# Altium footprint library SINA.PcbLib: 103 footprints (part 1 of 7)
Each footprint in its own frame and in the unit in brackets; x right, y up, seen from the top. Pads: shape width x height; smd on the part's side, far side on the other; paste and mask are expansions set on the pad; w line width, h text height; cw(c..) or ccw(c..) is an arc to the next point about the centre after c.
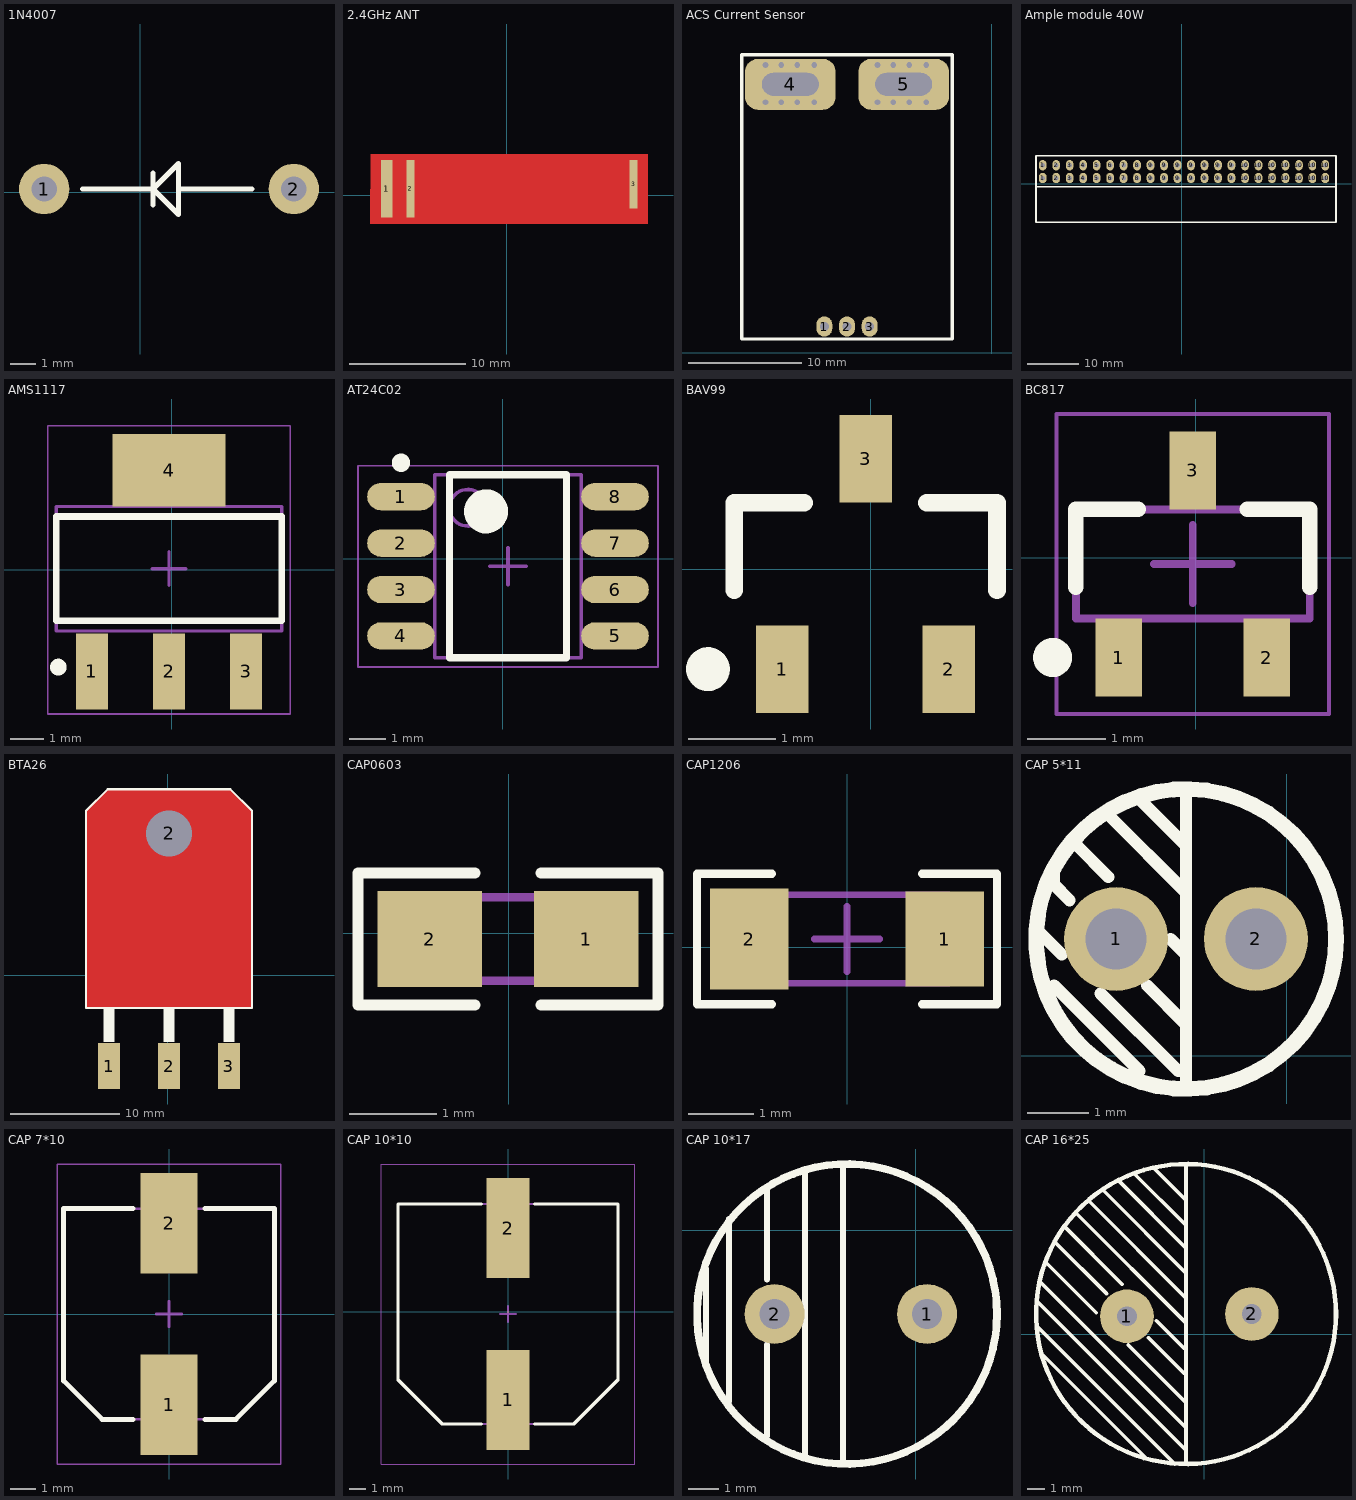
[diagram p0: the footprints below, top view; thin cyan lines are the x and y axes]

## 1N4007 [mm]
pads (2):
  round 2 hole 1: 1(-3.81,0.127) 2(6.096,0.127)
Top Overlay:
  lines w0.2: -2.286,0.127 0.508,0.127 ; 0.508,-0.508 0.508,0.762 ; 4.445,0.127 1.524,0.127 ; 0.508,0.127 1.524,-0.889 1.524,0.127 ; 0.508,0.127 1.524,1.143 1.524,0.127
3D body "User Library-DO-41-2.STEP": height 2.72, standoff -2.6, extent -4.369,-1.196 6.655,1.524

## 2.4GHz ANT [mm]
pads (3):
  rect 1x5 smd: 1(-10.364,0.558)
  rect 0.7x5 smd: 2(-8.332,0.558)
  rect 0.7x4.2 smd: 3(10.956,0.953)
Top Layer:
  rectangle: -10.854,2.353 -6.294,3.053
  region: -6.294,0.453 -6.294,3.053 -6.994,3.053 -6.994,0.453
  region: -4.094,1.153 -6.994,1.153 -6.994,0.453 -4.094,0.453
  region: -4.094,0.453 -4.094,3.053 -4.794,3.053 -4.794,0.453
  region: -1.894,3.053 -4.794,3.053 -4.794,2.353 -1.894,2.353
  region: -1.894,0.453 -1.894,3.053 -2.594,3.053 -2.594,0.453
  region: 0.306,1.153 -2.594,1.153 -2.594,0.453 0.306,0.453
  region: 0.306,0.453 0.306,3.053 -0.394,3.053 -0.394,0.453
  region: 2.506,3.053 -0.394,3.053 -0.394,2.353 2.506,2.353
  region: 2.506,0.453 2.506,3.053 1.806,3.053 1.806,0.453
  region: 4.706,1.153 1.806,1.153 1.806,0.453 4.706,0.453
  region: 4.706,0.453 4.706,3.053 4.006,3.053 4.006,0.453
  region: 6.906,3.053 4.006,3.053 4.006,2.353 6.906,2.353
  region: 6.906,0.453 6.906,3.053 6.206,3.053 6.206,0.453
  region: 9.106,1.153 6.206,1.153 6.206,0.453 9.106,0.453
  region: 9.106,0.453 9.106,3.053 8.406,3.053 8.406,0.453
  region: 11.306,3.053 8.406,3.053 8.406,2.353 11.306,2.353
  pour cut-out: -11.782,3.553 12.186,3.553 12.186,-2.487 -11.826,-2.487

## ACS Current Sensor [mm]
pads (5):
  oval 1.4x1.8 hole 0.8: 1(-14.8,2.3) 2(-12.8,2.3) 3(-10.8,2.3)
  rrect50% 8x4.5 hole 5 slot 2 at 90 deg: 4(-17.8,23.7) 5(-7.8,23.7)
via -5.8,22.1 diameter 0.9 hole 0.5
via -10.1,22.1 diameter 0.9 hole 0.5
via -8.7,22.1 diameter 0.9 hole 0.5
via -7.3,22.1 diameter 0.9 hole 0.5
via -7.3,25.4 diameter 0.9 hole 0.5
via -8.7,25.4 diameter 0.9 hole 0.5
via -10.1,25.4 diameter 0.9 hole 0.5
via -5.8,25.4 diameter 0.9 hole 0.5
via -15.7,22.1 diameter 0.9 hole 0.5
via -20,22.1 diameter 0.9 hole 0.5
via -18.6,22.1 diameter 0.9 hole 0.5
via -17.2,22.1 diameter 0.9 hole 0.5
via -17.2,25.4 diameter 0.9 hole 0.5
via -18.6,25.4 diameter 0.9 hole 0.5
via -20,25.4 diameter 0.9 hole 0.5
via -15.7,25.4 diameter 0.9 hole 0.5
Top Overlay:
  lines w0.3: -22.1,1.2 -3.5,1.2 -3.5,26.3 -22.1,26.3 -22.1,1.2
3D body "User Library-ACS759xCB.STEP": height 7.5, standoff -3, extent -19.8,2.1 -5.8,24.44

## Ample module 40W [mm]
pads (44):
  oval 1.5x2 hole 0.9: 1(-27.1,1.1) 1(-27.1,3.6) 2(-24.475,1.1) 2(-24.475,3.6) 3(-21.85,1.1) 3(-21.85,3.6) 4(-19.225,1.1) 4(-19.225,3.6) 5(-16.6,1.1) 5(-16.6,3.6) 6(-13.974,1.1) 6(-13.974,3.6) 7(-11.349,1.1) 7(-11.349,3.6) 8(-8.724,1.1) 8(-8.724,3.6) 9(-6.099,1.1) 9(-6.099,3.6) 9(-3.474,1.1) 9(-3.474,3.6) 9(-0.849,1.1) 9(-0.849,3.6) 9(1.776,1.1) 9(1.776,3.6) 9(4.401,1.1) 9(4.401,3.6) 9(7.027,1.1) 9(7.027,3.6) 9(9.652,1.1) 9(9.652,3.6) 10(12.277,1.1) 10(12.277,3.6) 10(14.902,1.1) 10(14.902,3.6) 10(17.527,1.1) 10(17.527,3.6) 10(20.152,1.1) 10(20.152,3.6) 10(22.777,1.1) 10(22.777,3.6) 10(25.402,1.1) 10(25.402,3.6) 10(27.903,1.1) 10(27.903,3.6)
Top Overlay:
  lines w0.3: -28.4,-0.6 30,-0.6 ; -28.4,-7.5 -28.4,5.45 30,5.45 30,-7.5 -28.4,-7.5
3D body "PCB1.step": height 42.12, standoff 2.1, extent -28.39,-7.6 39.19,5.5
3D body: height 2.5, standoff 0, extent -28.399,-0.15 30,5

## AMS1117 [mm]
pads (4):
  rect 0.95x2.25 smd: 1(-2.374,-3.019) 2(-0.084,-3.019) 3(2.206,-3.019)
  rect 3.35x2.15 smd: 4(-0.084,2.958)
Top Overlay:
  circle w0.25: c-3.374,-2.892 r0.125
  lines w0.2: -3.434,-1.517 3.266,-1.517 3.266,1.583 -3.434,1.583 -3.434,-1.517
Mechanical 13:
  lines w0.1: -3.434,-1.817 3.266,-1.817 3.266,1.883 -3.434,1.883 -3.434,-1.817
Mechanical 15:
  lines w0.05: -3.684,-4.285 3.516,-4.285 3.516,4.283 -3.684,4.283 -3.684,-4.285
  lines w0.1: -0.584,0.033 0.416,0.033 ; -0.084,-0.467 -0.084,0.533
3D body: height 1.8, standoff 0.02, extent -3.434,-1.817 3.266,1.883

## AT24C02 [mm]
pads (8):
  oval 1.85x0.75 smd: 1(-2.788,1.704) 2(-2.788,0.434) 3(-2.788,-0.836) 4(-2.788,-2.106) 5(3.062,-2.106) 6(3.062,-0.836) 7(3.062,0.434) 8(3.062,1.704)
Top Overlay:
  circle w0.25: c-2.788,2.629 r0.125
  circle w0.6: c-0.463,1.299 r0.3
  lines w0.2: -1.463,-2.701 -1.463,2.299 1.737,2.299 1.737,-2.701 -1.463,-2.701
Mechanical 13:
  circle w0.1: c-0.963,1.399 r0.5
  lines w0.1: -1.863,-2.701 -1.863,2.299 2.137,2.299 2.137,-2.701 -1.863,-2.701
Mechanical 15:
  lines w0.05: -3.963,-2.951 -3.963,2.549 4.237,2.549 4.237,-2.951 -3.963,-2.951
  lines w0.1: -0.363,-0.201 0.637,-0.201 ; 0.137,-0.701 0.137,0.299
3D body "LM358.step": height 1.35, standoff 0, extent -3.113,-2.701 3.387,2.299

## BAV99 [mm]
pads (3):
  rect 0.6x1 smd: 1(-1.011,-1.138) 2(0.889,-1.138) 3(-0.061,1.262)
Top Overlay:
  circle w0.25: c-1.861,-1.138 r0.125
  lines w0.2: -1.56,-0.238 -1.56,0.761 -0.761,0.761 ; 0.639,0.761 1.439,0.761 1.439,-0.238
3D body: height 1, standoff 0, extent -1.58,-0.283 1.447,0.796

## BC817 [mm]
pads (3):
  rect 0.6x1 smd: 1(-0.989,-1.28) 2(0.911,-1.28) 3(-0.039,1.12)
Top Overlay:
  circle w0.25: c-1.839,-1.28 r0.125
  lines w0.2: -1.539,-0.38 -1.539,0.62 -0.739,0.62 ; 0.661,0.62 1.461,0.62 1.461,-0.38
Mechanical 13:
  lines w0.1: -1.539,-0.78 1.461,-0.78 1.461,0.62 -1.539,0.62 -1.539,-0.78
Mechanical 15:
  lines w0.05: -1.789,-2.005 1.711,-2.005 1.711,1.845 -1.789,1.845 -1.789,-2.005
  lines w0.1: -0.539,-0.08 0.461,-0.08 ; -0.039,-0.58 -0.039,0.42
3D body: height 1.1, standoff 0.05, extent -1.539,-0.78 1.461,0.62

## BTA26 [mm]
pads (4):
  rect 2x4.2 smd: 1(-5.353,-8.301) 2(0.127,-8.301) 3(5.607,-8.301)
  round 3 hole 4.2: 2(0.127,12.954)
Top Layer:
  region: -7.493,-3.048 -7.493,14.986 -5.461,17.018 5.715,17.018 7.747,14.986 7.747,-3.048
Top Overlay:
  region: 6.115,-3.001 5.099,-3.001 5.099,-6.101 6.115,-6.101
  rectangle: -5.861,-6.101 -4.845,-3.001
  rectangle: -0.381,-6.101 0.635,-3.001
  lines w0.2: -7.473,-3.001 7.727,-3.001 7.727,14.999 5.727,16.999 -5.473,16.999 -7.473,14.999 -7.473,-3.001
Mechanical 1:
  circle w0.2: c0.127,12.999 r2
3D body "User Library-TO218-O.STEP": height 4.82, standoff -3, extent -7.372,-8.32 7.628,16.908

## CAP0603 [mm]
pads (2):
  rect 1.2x1.1 smd: 1(0.893,-0.064) 2(-0.907,-0.064)
Top Overlay:
  lines w0.127: -0.388,-0.826 -1.734,-0.826 -1.734,0.698 -0.388,0.698 ; 0.374,-0.826 1.72,-0.826 1.72,0.698 0.374,0.698
Mechanical 13:
  lines w0.1: -0.9,-0.547 -0.9,0.418 0.86,0.418 0.86,-0.547 -0.9,-0.547
3D body: height 0.6, standoff 0, extent -0.55,-0.547 0.515,0.418
3D body: height 0.6, standoff 0, extent 0.515,-0.547 0.865,0.408
3D body: height 0.6, standoff 0, extent -0.9,-0.547 -0.55,0.418

## CAP1206 [mm]
pads (2):
  rect 1.2x1.45 smd: 1(1.5,0.127)
  rect 1.2x1.55 smd: 2(-1.5,0.127)
Top Overlay:
  lines w0.127: -1.15,-0.873 -2.3,-0.873 -2.3,1.127 -1.15,1.127 ; 1.15,-0.873 2.3,-0.873 2.3,1.127 1.15,1.127
Mechanical 13:
  lines w0.1: -1.59,-0.548 1.56,-0.548 1.56,0.802 -1.59,0.802 -1.59,-0.548
Mechanical 15:
  lines w0.1: -0.5,0.127 0.5,0.127 ; 0,-0.373 0,0.627
3D body: height 0.6, standoff 0, extent 0.89,-0.548 1.57,0.802
3D body: height 0.6, standoff 0, extent -1.57,-0.548 -0.89,0.802
3D body: height 0.6, standoff 0, extent -0.89,-0.548 0.89,0.802

## CAP 5*11 [mm]
pads (2):
  round 1.7 hole 1: 1(-2.794,1.905) 2(-0.508,1.905)
Top Overlay:
  circle w0.254: c-1.651,1.905 r2.453
  lines w0.2: -4.064,2.032 -3.683,1.651 ; -3.81,1.143 -2.413,-0.254 ; -3.81,3.048 -3.81,2.921 -3.81,2.794 -3.556,2.54 ; -3.429,3.429 -2.921,2.921 ; -3.048,1.016 -1.778,-0.254 ; -2.921,3.937 -1.651,2.667 ; -2.413,4.191 -1.651,3.429 ; -2.286,1.143 -1.651,0.508 ; -1.905,1.905 -1.651,1.651 ; -1.651,-0.508 -1.651,4.318
3D body "User Library-5x11_5.STEP": height 11.55, standoff -19, extent -4.201,-0.635 0.899,4.465

## CAP 7*10 [mm]
pads (2):
  rect 2.25x4 smd: 1(0,-3.608) 2(0,3.608)
Top Overlay:
  lines w0.2: -1.425,-4.19 -2.657,-4.19 -4.19,-2.657 -4.19,4.19 -1.425,4.19 ; 1.425,-4.19 2.658,-4.19 4.19,-2.657 4.19,4.19 1.425,4.19
Mechanical 13:
  lines w0.1: -4.19,-2.657 -2.657,-4.19 2.658,-4.19 4.19,-2.657 4.19,4.19 -4.19,4.19 -4.19,-2.657
Mechanical 15:
  lines w0.05: -4.445,-5.969 4.445,-5.969 4.445,5.969 -4.445,5.969 -4.445,-5.969
  lines w0.1: -0.5,0 0.5,0 ; 0,-0.5 0,0.5
3D body: height 3.5, standoff 0, extent -4.19,-4.19 4.19,4.19
3D body: height 10.6, standoff 0, extent -4.044,-4.05 4.05,4.05

## CAP 10*10 [mm]
pads (2):
  rect 2.6x6 smd: 1(0,-5.277) 2(0,5.023)
Top Overlay:
  lines w0.2: -1.6,-6.727 -3.95,-6.727 -6.6,-4.077 -6.6,6.473 -1.6,6.473 ; 1.6,-6.727 3.95,-6.727 6.6,-4.077 6.6,6.473 1.6,6.473
Mechanical 13:
  lines w0.1: -6.6,-4.077 -3.95,-6.727 3.95,-6.727 6.6,-4.077 6.6,6.473 -6.6,6.473 -6.6,-4.077
Mechanical 15:
  lines w0.05: -7.6,-9.127 7.6,-9.127 7.6,8.873 -7.6,8.873 -7.6,-9.127
  lines w0.1: -0.5,-0.127 0.5,-0.127 ; 0,-0.627 0,0.373
3D body: height 4.5, standoff 0, extent -6.6,-6.727 6.6,6.473
3D body: height 13.5, standoff 0, extent -6.5,-6.627 6.5,6.373

## CAP 10*17 [mm]
pads (2):
  round 2 hole 1: 1(0.381,-2.794) 2(-4.699,-2.794)
Top Overlay:
  circle w0.254: c-2.286,-2.794 r5
  lines w0.2: -6.985,-4.445 -6.985,-1.27 ; -6.223,-5.715 -6.223,0.381 ; -4.953,-6.858 -4.953,-3.81 ; -4.953,-1.651 -4.953,1.397 ; -3.683,-7.493 -3.683,2.032 ; -2.413,-7.747 -2.413,2.159
3D body: height 17, standoff 0, extent -7.333,-7.747 2.667,2.253

## CAP 16*25 [mm]
pads (2):
  round 3 hole 1.1: 1(-4.318,1.016) 2(2.667,1.143)
Top Overlay:
  circle w0.254: c-1.016,1.143 r8.383
  lines w0.2: -9.335,0.445 -1.651,-7.239 ; -9.335,1.841 -1.016,-6.477 ; -9.144,2.921 -1.016,-5.207 ; -9.08,-1.079 -3.302,-6.858 ; -8.826,4 -6.032,1.206 ; -8.319,5.143 -5.461,2.286 ; -7.81,6.032 -4.572,2.794 ; -7.175,6.794 -1.016,0.635 ; -6.477,7.493 -1.016,2.032 ; -5.588,8.001 -1.016,3.429 ; -4.763,8.572 -1.016,4.826 ; -4.255,-0.572 -1.016,-3.81 ; -3.937,9.017 -1.016,6.096 ; -3.111,-0.191 -1.143,-2.159 ; -2.794,9.271 -1.016,7.493 ; -2.667,0.762 -1.143,-0.762 ; -1.016,-7.239 -1.016,9.525 ; -1.016,5.842 -1.016,6.096 ; -1.016,5.969 -1.016,6.096
3D body "User Library-T0904 20200304 16x25capacitor-400-47-1.STEP": height 26.5, standoff -2, extent -9.116,-6.967 7.104,9.253